# Altium footprint library 红旗_PcbLib_V1.0.PcbLib: 66 footprints (part 5 of 5)
Each footprint in its own frame and in the unit in brackets; x right, y up, seen from the top. Pads: shape width x height; smd on the part's side, far side on the other; paste and mask are expansions set on the pad; w line width, h text height; cw(c..) or ccw(c..) is an arc to the next point about the centre after c.
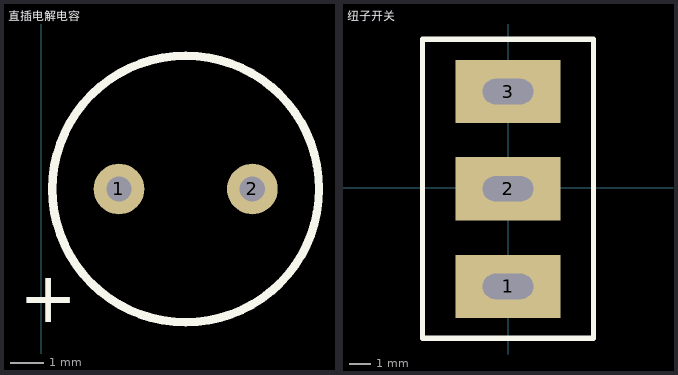
[diagram p4: the footprints below, top view; thin cyan lines are the x and y axes]

## 直插电解电容 [mil]
pads (2):
  round 60 hole 30: 1(91.73,250) 2(249.21,250)
Top Overlay:
  circle w10: c170.47,250 r157.48
  text "+" at -26.38,92.52 h60

## 纽子开关 [mm]
pads (3):
  rect 5x3 hole 1.2 slot 2.4 at 0 deg: 1(0,-4.699) 2(0,-0.051) 3(0,4.572)
Top Overlay:
  lines w0.254: -4.064,-7.163 4.064,-7.163 4.064,7.061 -4.064,7.061 -4.064,-7.163
3D body "55636avde.stp": height 33.36, standoff -2.35, extent -4.138,-6.625 3.861,6.575